# Altium integrated library Cap-General-THP_V2.IntLib: 122 symbols
Pins are listed as number, name and electrical type; pins without a type are passive.

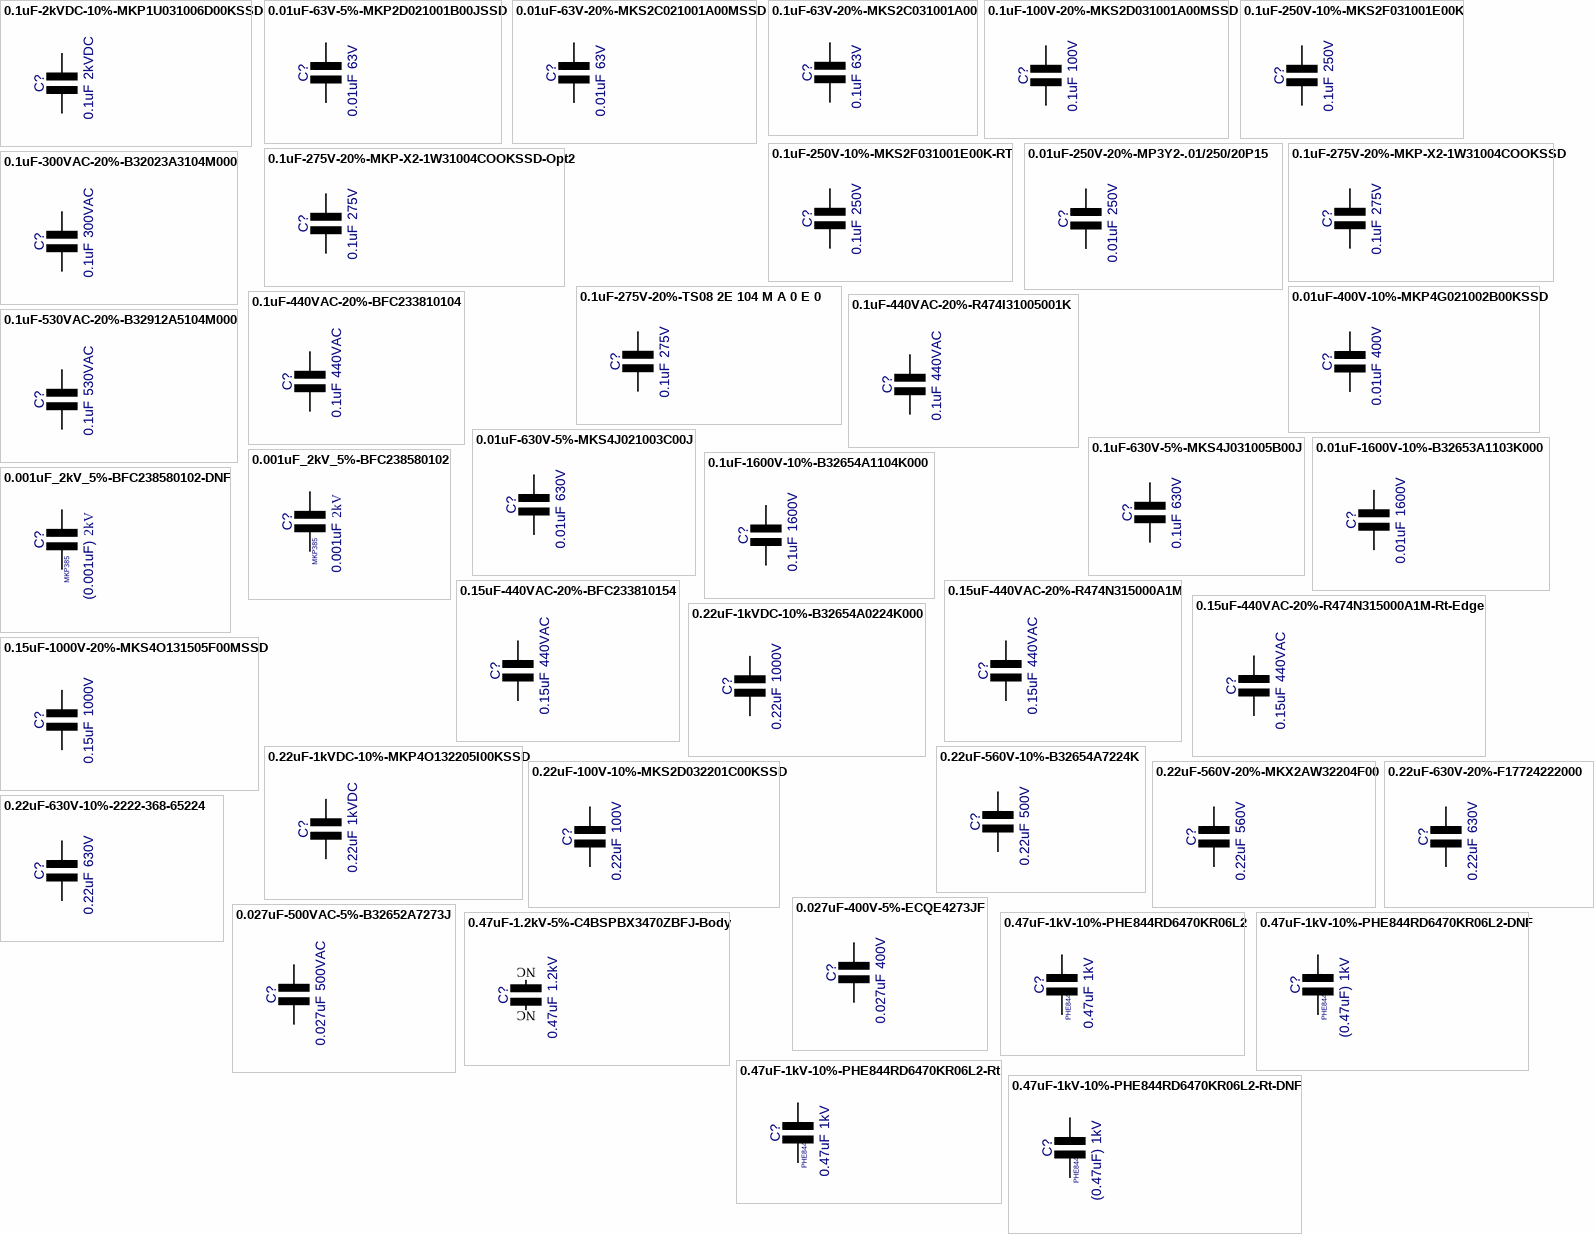
[diagram p0: symbols 0.1uF-2kVDC-10%-MKP1U031006D00KSSD to 0.47uF-1kV-10%-PHE844RD6470KR06L2-Rt-DNF]

## 0.1uF-2kVDC-10%-MKP1U031006D00KSSD
designator C?, comment value 0.1uF  Voltage: 2kVDC  (hidden comment: MKP1U031006D00KSSD)
Cap Metallized Polypropylene (PP) 700VAC 2kVDC; Manufacturer: Wima; Tol: 10%; Part Number: MKP1U031006D00KSSD; Package: Poly-31.5x13x24-27.5P-RED; EDM-PN: *; Text2: *; Text1: *
footprint Poly-31.5x13x24-27.5P-RED (Cap - Poly  31.5x14.0mm Red)
pins: 1, 2

## 0.01uF-63V-5%-MKP2D021001B00JSSD
designator C?, comment value 0.01uF  Voltage: 63V  (hidden comment: MKP2D021001B00JSSD)
Cap Polypropylene; Manufacturer: Wima; Tol: 5%; Part Number: MKP2D021001B00JSSD; Package: Poly 7.2x4.5x6.0-5; EDM-PN: *; Text2: *; Text1: *
footprint MKS2-3.0x7.2x7.5-5 (MKS2 3.0x7.2mm 7.5mm PCM 5.0)
pins: 1, 2

## 0.01uF-63V-20%-MKS2C021001A00MSSD
designator C?, comment value 0.01uF  Voltage: 63V  (hidden comment: MKS2C021001A00MSSD)
Cap Metallized Polyester; Manufacturer: Wima; Tol: 20%; Part Number: MKS2C021001A00MSSD; Package: MKS2-2.5x7.2x6.5-5; EDM-PN: *; Text2: *; Text1: *
footprint MKS2-2.5x7.2x6.5-5 (MKS2 2.5x7.2mm 6.5mm PCM 5.0)
pins: 1, 2

## 0.1uF-63V-20%-MKS2C031001A00
designator C?, comment value 0.1uF  Voltage: 63V  (hidden comment: MKS2C031001A00)
Cap Metallized Polyester; Manufacturer: Wima; Tol: 20%; Part Number: MKS2C031001A00; Package: MKS2-2.5x7.2x6.5-5; EDM-PN: *; Text2: *; Text1: *
footprint MKS2-2.5x7.2x6.5-5 (MKS2 2.5x7.2mm 6.5mm PCM 5.0)
pins: 1, 2

## 0.1uF-100V-20%-MKS2D031001A00MSSD
designator C?, comment value 0.1uF  Voltage: 100V  (hidden comment: MKS2D031001A00MSSD)
Cap Metallized Polyester 63V/100V; Manufacturer: Wima; Tol: 20%; Part Number: MKS2D031001A00MSSD; Package: MKS2-2.5x7.2x6.5-5; EDM-PN: *; Text2: *; Text1: *
footprint MKS2-2.5x7.2x6.5-5 (MKS2 2.5x7.2mm 6.5mm PCM 5.0)
pins: 1, 2

## 0.1uF-250V-10%-MKS2F031001E00K
designator C?, comment value 0.1uF  Voltage: 250V  (hidden comment: MKS2F031001E00K)
Cap Metallized Polyester; Manufacturer: Vishay; Tol: 10%; Part Number: MKS2F031001E00K; Package: MKS2-4.5x7.2x9.5-5; EDM-PN: *; Text2: *; Text1: *
footprint MKS2-4.5x7.2x9.5-5 (MKS2 4.5x7.2mm 9.5mm PCM 5.0)
pins: 1, 2

## 0.1uF-250V-10%-MKS2F031001E00K-RT
designator C?, comment value 0.1uF  Voltage: 250V  (hidden comment: MKS2F031001E00K)
Cap Metallized Polyester; Manufacturer: Vishay; Tol: 10%; Part Number: MKS2F031001E00K; Package: MKS2-4.5x7.2x9.5-5-RT; EDM-PN: *; Text2: *; Text1: *
footprint MKS2-4.5x7.2x9.5-5-RT (MKS2 4.5x7.2mm 9.5mm PCM 5.0)
pins: 1, 2

## 0.01uF-250V-20%-MP3Y2-.01/250/20P15
designator C?, comment value 0.01uF  Voltage: 250V  (hidden comment: MP3Y2-.01/250/20P15)
Cap Metallized Paper (MP)  RFI-Capacitors Class Y2; Manufacturer: Wima; Tol: 20%; Part Number: MP3Y2-.01/250/20P15; Package: Poly-19x5x13-15P; EDM-PN: *; Text2: *; Text1: *
footprint Poly-19x5x13-15P (Cap Poly  19x5-13mm 15mm Pitch)
pins: 1, 2

## 0.1uF-275V-20%-MKP-X2-1W31004COOKSSD
designator C?, comment value 0.1uF  Voltage: 275V  (hidden comment: MKP-X2-1W31004COOKSSD)
Cap Metallized Polypropylene X2; Manufacturer: Vishay; Tol: 20%; Part Number: MKP-X2-1W31004COOKSSD; Package: Poly-18x5x11-15P; EDM-PN: *; Text2: *; Text1: *
footprint Poly-18x5x11-15P (Cap Poly  18x5-11mm 15mm Pitch)
pins: 1, 2

## 0.1uF-275V-20%-MKP-X2-1W31004COOKSSD-Opt2
designator C?, comment value 0.1uF  Voltage: 275V  (hidden comment: MKP-X2-1W31004COOKSSD)
Cap Metallized Polypropylene X2; Manufacturer: Vishay; Tol: 20%; Part Number: MKP-X2-1W31004COOKSSD; Package: Poly-18x5x11-15P+2P; EDM-PN: *; Text2: *; Text1: *
footprint Poly-18x5x11-15P+2P (Cap Poly  18x5-11mm 15mm Pitch)
pins: 1, 2

## 0.1uF-275V-20%-TS08 2E 104 M A 0 E 0
designator C?, comment value 0.1uF  Voltage: 275V  (hidden comment: TS08 2E 104 M A 0 E 0)
Cap Metallized Polypropylene X2 250V; Manufacturer: Suntan; Tol: 20%; Part Number: TS08 2E 104 M A 0 E 0; Package: Poly-18x6x12-15P; EDM-PN: *; Text2: *; Text1: *
footprint Poly-18x6x12-15P (Cap Poly  18x6-12mm 15mm Pitch)
pins: 1, 2

## 0.1uF-300VAC-20%-B32023A3104M000
designator C?, comment value 0.1uF  Voltage: 300VAC  (hidden comment: B32023A3104M000)
Cap Metallized Polypropylene Y1 300VAC/1500VDC; Manufacturer: Epcos; Tol: 20%; Reutech PN: 5910-PP-0031; Part Number: B32023A3104M000; Package: POLY-26.5x8.5x17.5-22.5P-BL; EDM-PN: *; Text2: *; Text1: *
footprint POLY-26.5x8.5x17.5-22.5P-BL (Cap- Poly 26.5x8.5mm 22.5 Pitch)
pins: 1, 2

## 0.01uF-400V-10%-MKP4G021002B00KSSD
designator C?, comment value 0.01uF  Voltage: 400V  (hidden comment: MKP4G021002B00KSSD)
Cap Film Polypropylene; Manufacturer: Wima; Tol: 10%; Part Number: MKP4G021002B00KSSD; Package: Poly-10x3.0-8.5-7.5P; EDM-PN: *; Text2: *; Text1: *
footprint Poly-10.0x3.0-8.5-7.5P (Cap Poly  10.0x3.0-8.5mm 7.5mm Pitch)
pins: 1, 2

## 0.1uF-440VAC-20%-BFC233810104
designator C?, comment value 0.1uF  Voltage: 440VAC  (hidden comment: BFC233810104)
Cap Metallized Polypropylene X1; Manufacturer: Vishay; Tol: 20%; Part Number: BFC233810104; Package: Poly-17.5x10x16.5-15P-GRAY; EDM-PN: *; Text2: *; Text1: *
footprint Poly-17.5x10x16.5-15P-GRAY (Cap Poly  17.5x10mm 15mm Pitch)
pins: 1, 2

## 0.1uF-440VAC-20%-R474I31005001K
designator C?, comment value 0.1uF  Voltage: 440VAC  (hidden comment: R474I31005001K)
Cap Metallized Polypropylene X2; Manufacturer: Kemet; Tol: 20%; Part Number: R474I31005001K; Package: Poly-18x11x19-15P; EDM-PN: *; Text2: *; Text1: *
footprint Poly-18x11x19-15P (Cap Poly  18x11mm 15mm Pitch)
pins: 1, 2

## 0.1uF-530VAC-20%-B32912A5104M000
designator C?, comment value 0.1uF  Voltage: 530VAC  (hidden comment: B32912A5104M000)
Cap Metallized Polypropylene X1 530VAC/1000VDC; Manufacturer: Epcos; Tol: 20%; Reutech PN: 5910-PP-0032; Part Number: B32912A5104M000; Package: Poly-18x11x19-15P-BLUE; EDM-PN: *; Text2: *; Text1: *
footprint Poly-18x11x19-15P-BLUE (Cap Poly  18x11mm 15mm Pitch)
pins: 1, 2

## 0.01uF-630V-5%-MKS4J021003C00J
designator C?, comment value 0.01uF  Voltage: 630V  (hidden comment: MKS4J021003C00J)
Cap Metallized Polyester; Manufacturer: Wima; Tol: 5%; Part Number: MKS4J021003C00J; Package: Poly-13x4.0-9-10P; EDM-PN: *; Text2: *; Text1: *
footprint Poly-13x4.0-9-10P (Cap Poly  13.0x4.0-9mm 10mm Pitch)
pins: 1, 2

## 0.1uF-630V-5%-MKS4J031005B00J
designator C?, comment value 0.1uF  Voltage: 630V  (hidden comment: MKS4J031005B00J)
Cap Metallized Polyester; Manufacturer: Wima; Tol: 5%; Part Number: MKS4J031005B00J; Package: Poly-13x4.0-9-10P; EDM-PN: *; Text2: *; Text1: *
footprint POLY-26.5x6.0x15.0-22.5P (Cap- Poly 26.5x6.0mm 22.5 Pitch)
pins: 1, 2

## 0.01uF-1600V-10%-B32653A1103K000
designator C?, comment value 0.01uF  Voltage: 1600V  (hidden comment: B32653A1103K000)
Cap Metallized Polypropylene 1.6kV DC/500V AC; Manufacturer: TDK; Tol: 10%; Part Number: B32653A1103K000; Package: POLY-26.5x6.0x15.0-22.5P-Blue; EDM-PN: *; Text2: *; Text1: *
footprint POLY-26.5x6.0x15.0-22.5P-Blue (Cap- Poly 26.5x6.0mm 22.5 Pitch)
pins: 1, 2

## 0.1uF-1600V-10%-B32654A1104K000
designator C?, comment value 0.1uF  Voltage: 1600V  (hidden comment: B32654A1104K000)
Cap Metallized Polypropylene 1.6kV DC/500V AC; Manufacturer: TDK; Tol: 10%; Part Number: B32654A1104K000; Package: Poly-31.5x14x24.5-27.5P-BLUE; EDM-PN: *; Text2: *; Text1: *
footprint Poly-31.5x14x24.5-27.5P-BLUE (Cap - Poly  31.5x14.0mm)
pins: 1, 2

## 0.001uF_2kV_5%-BFC238580102
designator C?, comment value 0.001uF  Voltage: 2kV  Text1: MKP385  (hidden comment: BFC238580102)
Cap Metallized Polypropylene Film; Manufacturer: Vishay; Tol: 5%; Part Number: BFC238580102; Package: POLY-12.5x3.0-10.0-10P; EDM-PN: *; Text2: *
footprint Poly-12.5x4.0-10.0-10P (Cap Poly  12.5x4.0-10mm 10mm Pitch)
pins: 1, 2

## 0.001uF_2kV_5%-BFC238580102-DNF
designator C?, comment value (0.001uF)  Voltage: 2kV  Text1: MKP385  (hidden comment: BFC238580102)
Cap Metallized Polypropylene Film - Do not Fit; Manufacturer: Vishay; Part Number: DNF - BFC238580102; Tol: 5%; Package: POLY-12.5x3.0-10.0-10P; EDM-PN: *; Text2: *
footprint Poly-12.5x4.0-10.0-10P (Cap Poly  12.5x4.0-10mm 10mm Pitch)
pins: 1, 2

## 0.15uF-440VAC-20%-BFC233810154
designator C?, comment value 0.15uF  Voltage: 440VAC  (hidden comment: BFC233810154)
Cap Interference Suppression Film - Class X1; Manufacturer: Vishay; Tol: 20%; Part Number: BFC233810154; Package: Poly-26.5x8.5x18.5; EDM-PN: *; Text2: *; Text1: *
footprint POLY-26.5x8.5x18.5 (Cap- Poly 26.5x8.5mm 22.5 Pitch)
pins: 1, 2

## 0.15uF-440VAC-20%-R474N315000A1M
designator C?, comment value 0.15uF  Voltage: 440VAC  (hidden comment: R474N315000A1M)
Cap Metallized Polypropylene Film - Class X1; Manufacturer: Kemet; Tol: 20%; Part Number: R474N315000A1M; Package: POLY-26.5x10.0x18.5-BL; EDM-PN: *; Text2: *; Text1: *
footprint POLY-26.5x10.0x18.5-BL (Cap- Poly 26.5x10.0mm 22.5 Pitch)
pins: 1, 2

## 0.15uF-440VAC-20%-R474N315000A1M-Rt-Edge
designator C?, comment value 0.15uF  Voltage: 440VAC  (hidden comment: R474N315000A1M)
Cap Metallized Polypropylene Film - Class X1; Manufacturer: Kemet; Tol: 20%; Part Number: R474N315000A1M; Package: POLY-26.5x10.0x18.5-BL-Rt-Edge; EDM-PN: *; Text2: *; Text1: *
footprint POLY-26.5x10.0x18.5-BL-Rt-Edge (Cap- Poly 26.5x18.5mm 22.5 Pitch)
pins: 1, 2

## 0.15uF-1000V-20%-MKS4O131505F00MSSD
designator C?, comment value 0.15uF  Voltage: 1000V  (hidden comment: MKS4O131505F00MSSD _)
Cap Metallized Polyester; Manufacturer: Wima; Tol: 20%; Part Number: MKS4O131505F00MSSD; Package: Poly-26.5x8.5x18.5; EDM-PN: *; Text2: *; Text1: *
footprint POLY-26.5x8.5x18.5 (Cap- Poly 26.5x8.5mm 22.5 Pitch)
pins: 1, 2

## 0.22uF-1kVDC-10%-B32654A0224K000
designator C?, comment value 0.22uF  Voltage: 1000V  (hidden comment: B32654A0224K000)
Cap Metallized Polypropylene 250VAC/1000VDC; Manufacturer: Epcos; EDM-PN: CAP1432; Tol: 10%; Part Number: B32654A0224K000; Package: Poly-31.5x11x21-27.5P-BLUE; Text2: *; Text1: *
footprint Poly-31.5x11x21-27.5P-BLUE (Cap - Poly  31.5x11.0mm)
pins: 1, 2

## 0.22uF-1kVDC-10%-MKP4O132205I00KSSD
designator C?, comment value 0.22uF  Voltage: 1kVDC  (hidden comment: MKP4O132205I00KSSD)
Cap Metallized Polypropylene (PP) 400VAC 1kVDC; Manufacturer: Wima; Tol: 10%; Part Number: MKP4O132205I00KSSD; Package: POLY-26.5x11.0x21.0-22.5P-RED; EDM-PN: *; Text2: *; Text1: *
footprint POLY-26.5x11.0x21.0-22.5P-RED (Cap- Poly 26.5x11.0mm 22.5 Pitch)
pins: 1, 2

## 0.22uF-100V-10%-MKS2D032201C00KSSD
designator C?, comment value 0.22uF  Voltage: 100V  (hidden comment: MKS2D032201C00KSSD)
Cap Polyester Film; Manufacturer: Wima; Tol: 10%; Part Number: MKS2D032201C00KSSD; Package: Poly 7.3x3.5x8.0-5; EDM-PN: *; Text2: *; Text1: *
footprint Poly 7.3x3.5x8.0-5 (Cap Poly  7.3x3.5x8.0mmm)
pins: 1, 2

## 0.22uF-560V-10%-B32654A7224K
designator C?, comment value 0.22uF  Voltage: 500V  (hidden comment: B32654A7224K)
Cap Metallized Polypropylene; Manufacturer: Epcos; Tol: 10%; Part Number: B32654A7224K; Package: Poly-31.5x14x24.5-27.5P-BLUE; EDM-PN: *; Text2: *; Text1: *
footprint Poly-31.5x14x24.5-27.5P-BLUE (Cap - Poly  31.5x14.0mm)
pins: 1, 2

## 0.22uF-560V-20%-MKX2AW32204F00
designator C?, comment value 0.22uF  Voltage: 560V  (hidden comment: MKX2AW32204F00)
Cap Metallized Polypropylene X2 305V AC; Manufacturer: Wima; Tol: 20%; Part Number: MKX2AW32204F00; Package: Poly-18x8x15-15P; EDM-PN: *; Text2: *; Text1: *
footprint Poly-18x5x11-15P (Cap Poly  18x5-11mm 15mm Pitch)
pins: 1, 2

## 0.22uF-630V-10%-2222-368-65224
designator C?, comment value 0.22uF  Voltage: 630V  (hidden comment: 2222-368-65224)
Cap Metallized Polyester Film 250V/630V; Manufacturer: Vishay; Tol: 10%; Part Number: 2222-368-65224; Package: POLY-26.5x10.0x19.5-22.5P-BL; EDM-PN: *; Text2: *; Text1: *
footprint POLY-26.5x10.0x19.5-22.5P-BL (Cap- Poly 26.5x10.0mm 22.5 Pitch)
pins: 1, 2

## 0.22uF-630V-20%-F17724222000
designator C?, comment value 0.22uF  Voltage: 630V  (hidden comment: F17724222000)
Cap Metallized Polyester X2; Manufacturer: Vishay; Tol: 20%; Part Number: F17724222000; Package: POLY-26.5x8.5x16.5-22.5P-GR; EDM-PN: *; Text2: *; Text1: *
footprint POLY-26.5x8.5x16.5-22.5P-GR (Cap- Poly 26.5x8.5mm 22.5 Pitch)
pins: 1, 2

## 0.027uF-400V-5%-ECQE4273JF
designator C?, comment value 0.027uF  Voltage: 400V  (hidden comment: ECQE4273JF)
Cap Metallized Polyester; Manufacturer: Panasonic; Tol: 5%; Part Number: ECQE4273JF; Package: ECQE-10.3x5.5-8.0-7.5P; EDM-PN: *; Text2: *; Text1: *
footprint ECQE-10.3x5.5-8.0-7.5P (Cap Poly  10.3x5.5-8.0mm 7.5mm Pitch)
pins: 1, 2

## 0.027uF-500VAC-5%-B32652A7273J
designator C?, comment value 0.027uF  Voltage: 500VAC  (hidden comment: B32652A7273J)
Cap Metallized Polypropylene (PP); Manufacturer: Epcos; Tol: 5%; Part Number: B32652A7273J; Package: Poly-18x9x17.5-15P; EDM-PN: *; Text2: *; Text1: *
footprint Poly-18x9x17.5-15P (Cap Poly  18x9mm 15mm Pitch)
pins: 1, 2

## 0.47uF-1.2kV-5%-C4BSPBX3470ZBFJ-Body
designator C?, comment value 0.47uF  Voltage: 1.2kV  (hidden comment: C4BSPBX3470ZBFJ)
Cap Metallized Polypropylene; Manufacturer: Kemet; Tol: 5%; Part Number: C4BSPBX3470ZBFJ; Package: CAP-C4BSPBX-Body; EDM-PN: *; Text2: *; Text1: *
footprint CAP-C4BSPBX-Body (C4BSPBX 41.5x20mm)
text: NC

## 0.47uF-1kV-10%-PHE844RD6470KR06L2
designator C?, comment value 0.47uF  Text1: PHE844  Voltage: 1kV  (hidden comment: PHE844RD6470KR06L2)
Cap Metallized Polypropylene X1 440VAC/1kVDC; Manufacturer: Kemet; Tol: 10%; Part Number: PHE844RD6470KR06L2; Package: POLY-26.0x15.5x24.5-22.5P; EDM-PN: *; Text2: *
footprint POLY-26.0x15.5x24.5-22.5P (Cap- Poly 26.0x15.5mm 22.5 Pitch)
pins: 1, 2

## 0.47uF-1kV-10%-PHE844RD6470KR06L2-DNF
designator C?, comment value (0.47uF)  Text1: PHE844  Voltage: 1kV  (hidden comment: PHE844RD6470KR06L2)
Cap Metallized Polypropylene X1 440VAC/1kVDC - Do not Fit; Manufacturer: Kemet; Part Number: DNF - PHE844RD6470KR06L2; Tol: 10%; Package: POLY-26.0x15.5x24.5-22.5P; EDM-PN: *; Text2: *
footprint POLY-26.0x15.5x24.5-22.5P (Cap- Poly 26.0x15.5mm 22.5 Pitch)
pins: 1, 2

## 0.47uF-1kV-10%-PHE844RD6470KR06L2-Rt
designator C?, comment value 0.47uF  Text1: PHE844  Voltage: 1kV  (hidden comment: PHE844RD6470KR06L2)
Cap Metallized Polypropylene X1 440VAC/1kVDC; Manufacturer: Kemet; Tol: 10%; Part Number: PHE844RD6470KR06L2; Package: POLY-26.0x15.5x24.5-22.5P-Rt; EDM-PN: *; Text2: *
footprint POLY-26.0x15.5x24.5-22.5P-Rt (Cap- Poly 26.0x15.5mm 22.5 Pitch)
pins: 1, 2

## 0.47uF-1kV-10%-PHE844RD6470KR06L2-Rt-DNF
designator C?, comment value (0.47uF)  Text1: PHE844  Voltage: 1kV  (hidden comment: PHE844RD6470KR06L2)
Cap Metallized Polypropylene X1 440VAC/1kVDC - Do not Fit; Manufacturer: Kemet; Tol: 10%; Part Number: PHE844RD6470KR06L2; Package: POLY-26.0x15.5x24.5-22.5P-Rt; EDM-PN: *; Text2: *
footprint POLY-26.0x15.5x24.5-22.5P-Rt (Cap- Poly 26.0x15.5mm 22.5 Pitch)
pins: 1, 2

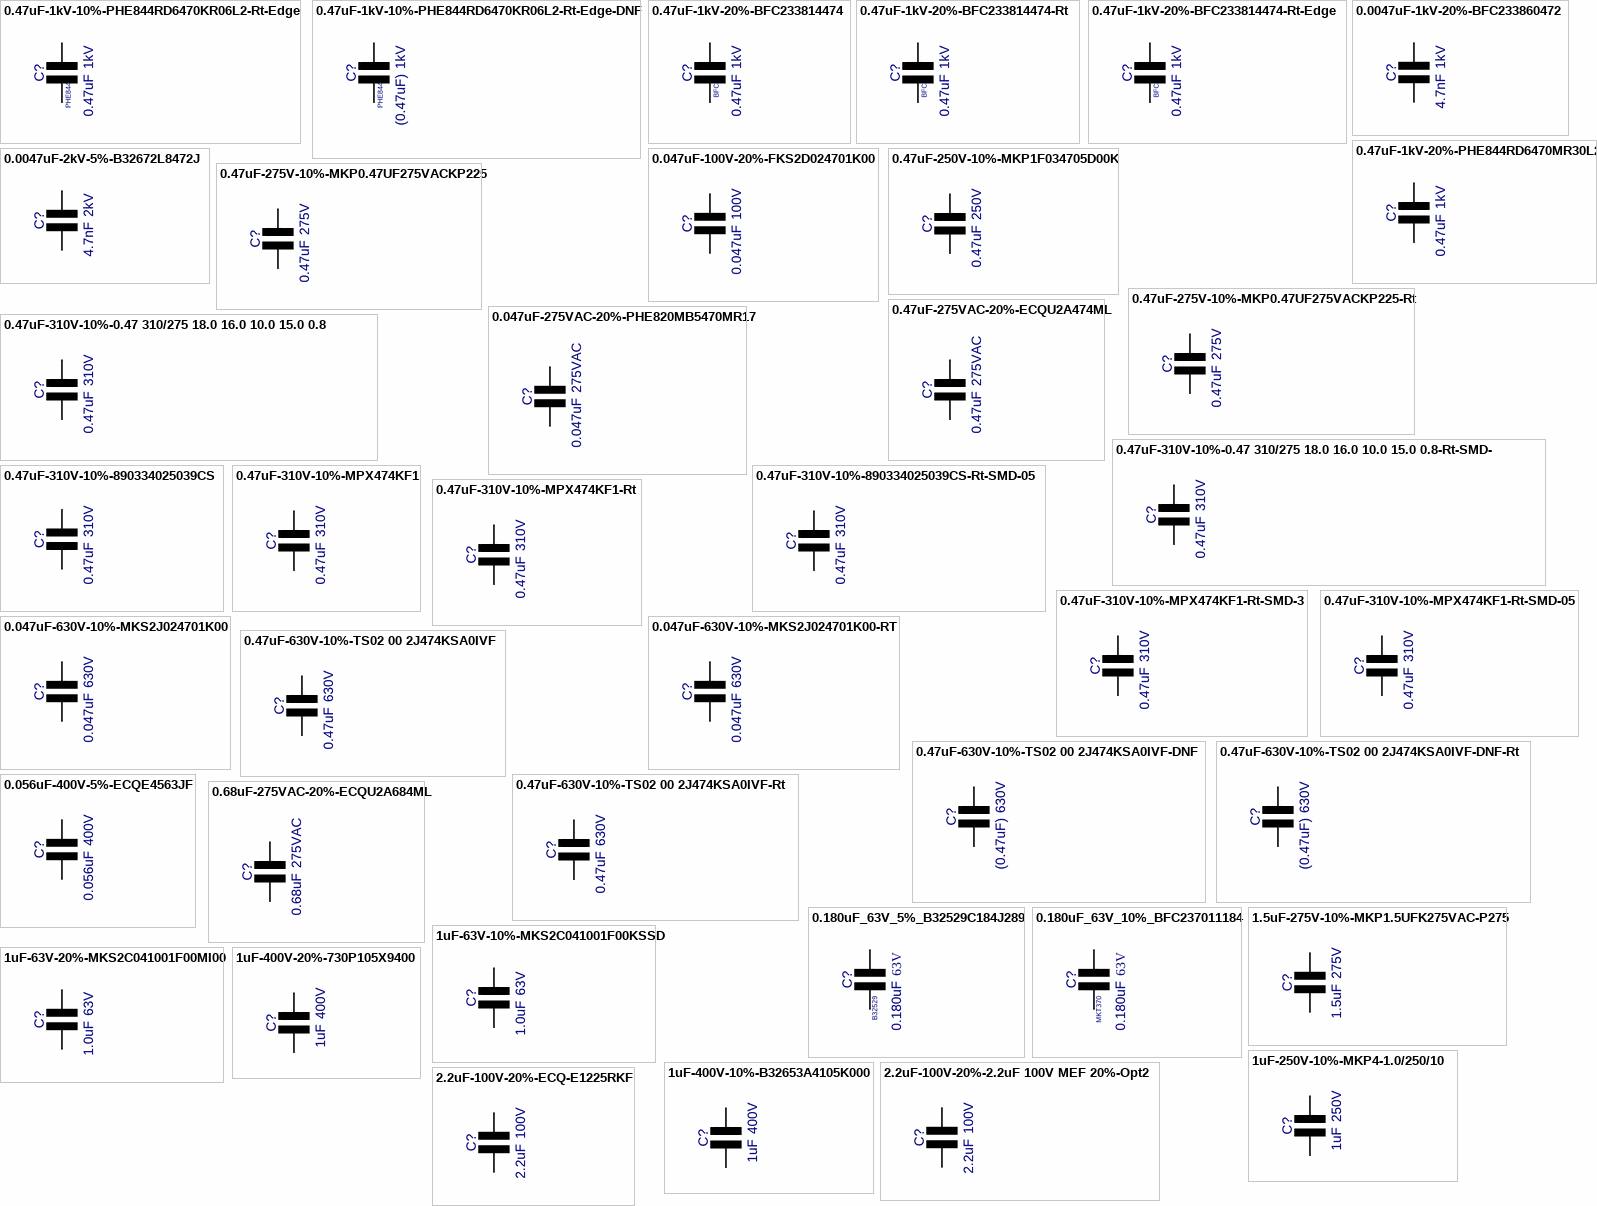
[diagram p1: symbols 0.47uF-1kV-10%-PHE844RD6470KR06L2-Rt-Edge to 2.2uF-100V-20%-ECQ-E1225RKF]

## 0.47uF-1kV-10%-PHE844RD6470KR06L2-Rt-Edge
designator C?, comment value 0.47uF  Text1: PHE844  Voltage: 1kV  (hidden comment: PHE844RD6470KR06L2)
Cap Metallized Polypropylene X1 440VAC/1kVDC; Manufacturer: Kemet; Tol: 10%; Part Number: PHE844RD6470KR06L2; Package: POLY-26.0x15.5x24.5-22.5P-Rt-Edge; EDM-PN: *; Text2: *
footprint POLY-26.0x15.5x24.5-22.5P-Rt-Edge (Cap- Poly 26.0x15.5mm 22.5 Pitch)
pins: 1, 2

## 0.47uF-1kV-10%-PHE844RD6470KR06L2-Rt-Edge-DNF
designator C?, comment value (0.47uF)  Text1: PHE844  Voltage: 1kV  (hidden comment: PHE844RD6470KR06L2)
Cap Metallized Polypropylene X1 440VAC/1kVDC - Do not Fit; Manufacturer: Kemet; Part Number: DNF - PHE844RD6470KR06L2; Tol: 10%; Package: POLY-26.0x15.5x24.5-22.5P-Rt-Edge; EDM-PN: *; Text2: *
footprint POLY-26.0x15.5x24.5-22.5P-Rt-Edge (Cap- Poly 26.0x15.5mm 22.5 Pitch)
pins: 1, 2

## 0.47uF-1kV-20%-BFC233814474
designator C?, comment value 0.47uF  Text1: BFC  Voltage: 1kV  (hidden comment: BFC233814474)
Cap Metallized Polypropylene X1 440VAC/1kVDC; Manufacturer: Vishay; Tol: 20%; Part Number: BFC233814474; Package: Poly-31.5x15x26-27.5P-BLUE; EDM-PN: *; Text2: *
footprint Poly-31.5x15x26-27.5P-BLUE (Cap - Poly  31.5x15.0mm)
pins: 1, 2

## 0.47uF-1kV-20%-BFC233814474-Rt
designator C?, comment value 0.47uF  Text1: BFC  Voltage: 1kV  (hidden comment: BFC233814474)
Cap Metallized Polypropylene X1 440VAC/1kVDC; Manufacturer: Vishay; Tol: 20%; Part Number: BFC233814474; Package: Poly-31.5x15x26-27.5P-BLUE-Rt; EDM-PN: *; Text2: *
footprint Poly-31.5x15x26-27.5P-BLUE-Rt (Cap - Poly  31.5x26.0mm)
pins: 1, 2

## 0.47uF-1kV-20%-BFC233814474-Rt-Edge
designator C?, comment value 0.47uF  Text1: BFC  Voltage: 1kV  (hidden comment: BFC233814474)
Cap Metallized Polypropylene X1 440VAC/1kVDC; Manufacturer: Vishay; Tol: 20%; Part Number: BFC233814474; Package: Poly-31.5x15x26-27.5P-BLUE-Rt-Edge; EDM-PN: *; Text2: *
footprint Poly-31.5x15x26-27.5P-BLUE-Rt_Edge (Cap - Poly  31.5x26.0mm)
pins: 1, 2

## 0.0047uF-1kV-20%-BFC233860472
designator C?, comment value 4.7nF  Voltage: 1kV  (hidden comment: BFC233860472)
Cap Metallized Polypropylene Y2 300V AC; Manufacturer: Vishay; Tol: 20%; Part Number: BFC233860472; Package: Poly-10.0x6.0-11.5-7.5P; EDM-PN: *; Text2: *; Text1: *
footprint Poly-10.0x6.0-11.5-7.5P (Cap Poly  10.0x6.0-11.5mm 7.5mm Pitch)
pins: 1, 2

## 0.47uF-1kV-20%-PHE844RD6470MR30L2
designator C?, comment value 0.47uF  Voltage: 1kV  (hidden comment: PHE844RD6470MR30L2)
Cap Metallized Polypropylene; Manufacturer: Kemet; Tol: 20%; Part Number: PHE844RD6470MR30L2; Package: POLY-26.0x15.5x24.5-22.5P; EDM-PN: *; Text2: *; Text1: *
footprint POLY-26.0x15.5x24.5-22.5P (Cap- Poly 26.0x15.5mm 22.5 Pitch)
pins: 1, 2

## 0.0047uF-2kV-5%-B32672L8472J
designator C?, comment value 4.7nF  Voltage: 2kV  (hidden comment: B32672L8472J)
Cap Metallized Polypropylene High V AC; Manufacturer: TDK; Tol: 5%; Part Number: B32672L8472J; Package: Poly-18x5x11-15P; EDM-PN: *; Text2: *; Text1: *
footprint Poly-18x5x11-15P (Cap Poly  18x5-11mm 15mm Pitch)
pins: 1, 2

## 0.047uF-100V-20%-FKS2D024701K00
designator C?, comment value 0.047uF  Voltage: 100V  (hidden comment: FKS2D024701K00)
Cap Polyester Film; Manufacturer: Wima; Tol: 20%; Part Number: FKS2D024701K00; Package: Poly 7.2x2.5-5; EDM-PN: *; Text2: *; Text1: *
footprint Poly 7.2x2.5-5 (Cap Poly  7.2x2.5x6.5mm)
pins: 1, 2

## 0.47uF-250V-10%-MKP1F034705D00K
designator C?, comment value 0.47uF  Voltage: 250V  (hidden comment: MKP1F034705D00K)
Cap Metallized Polypropylene; Manufacturer: Wima; Tol: 10%; Part Number: MKP1F034705D00K; Package: MKP10-26.5x7.0x16.5mm 22.5mm; EDM-PN: *; Text2: *; Text1: *
footprint MKP10-26.5x7.0x16.5mm 22.5mm (MKP10-26.5x7.0x16.5mm)
pins: 1, 2

## 0.47uF-275V-10%-MKP0.47UF275VACKP225
designator C?, comment value 0.47uF  Voltage: 275V  (hidden comment: MKP0.47UF275VACKP225)
Cap Metallized Polypropylene - X2; Manufacturer: Jimson; Tol: 10%; Part Number: MKP0.47UF275VACKP225; Package: Poly-31.5x11x21-27.5P-Yell; EDM-PN: *; Text2: *; Text1: *
footprint Poly-31.5x11x21-27.5P-Yell (Cap - Poly  31.5x11.0mm)
pins: 1, 2

## 0.47uF-275V-10%-MKP0.47UF275VACKP225-Rt
designator C?, comment value 0.47uF  Voltage: 275V  (hidden comment: MKP0.47UF275VACKP225)
Cap Metallized Polypropylene - X2; Manufacturer: Jimson; Tol: 10%; Part Number: MKP0.47UF275VACKP225; Package: Poly-31.5x11x21-27.5P-Yell-RT; EDM-PN: *; Text2: *; Text1: *
footprint Poly-31.5x11x21-27.5P-Yell-RT (Cap - Poly  31.5x11.0mm)
pins: 1, 2
